# Altium footprint library ref-packages.PCBLIB: 1544 footprints (part 67 of 103)
Each footprint in its own frame and in the unit in brackets; x right, y up, seen from the top. Pads: shape width x height; smd on the part's side, far side on the other; paste and mask are expansions set on the pad; w line width, h text height; cw(c..) or ccw(c..) is an arc to the next point about the centre after c.
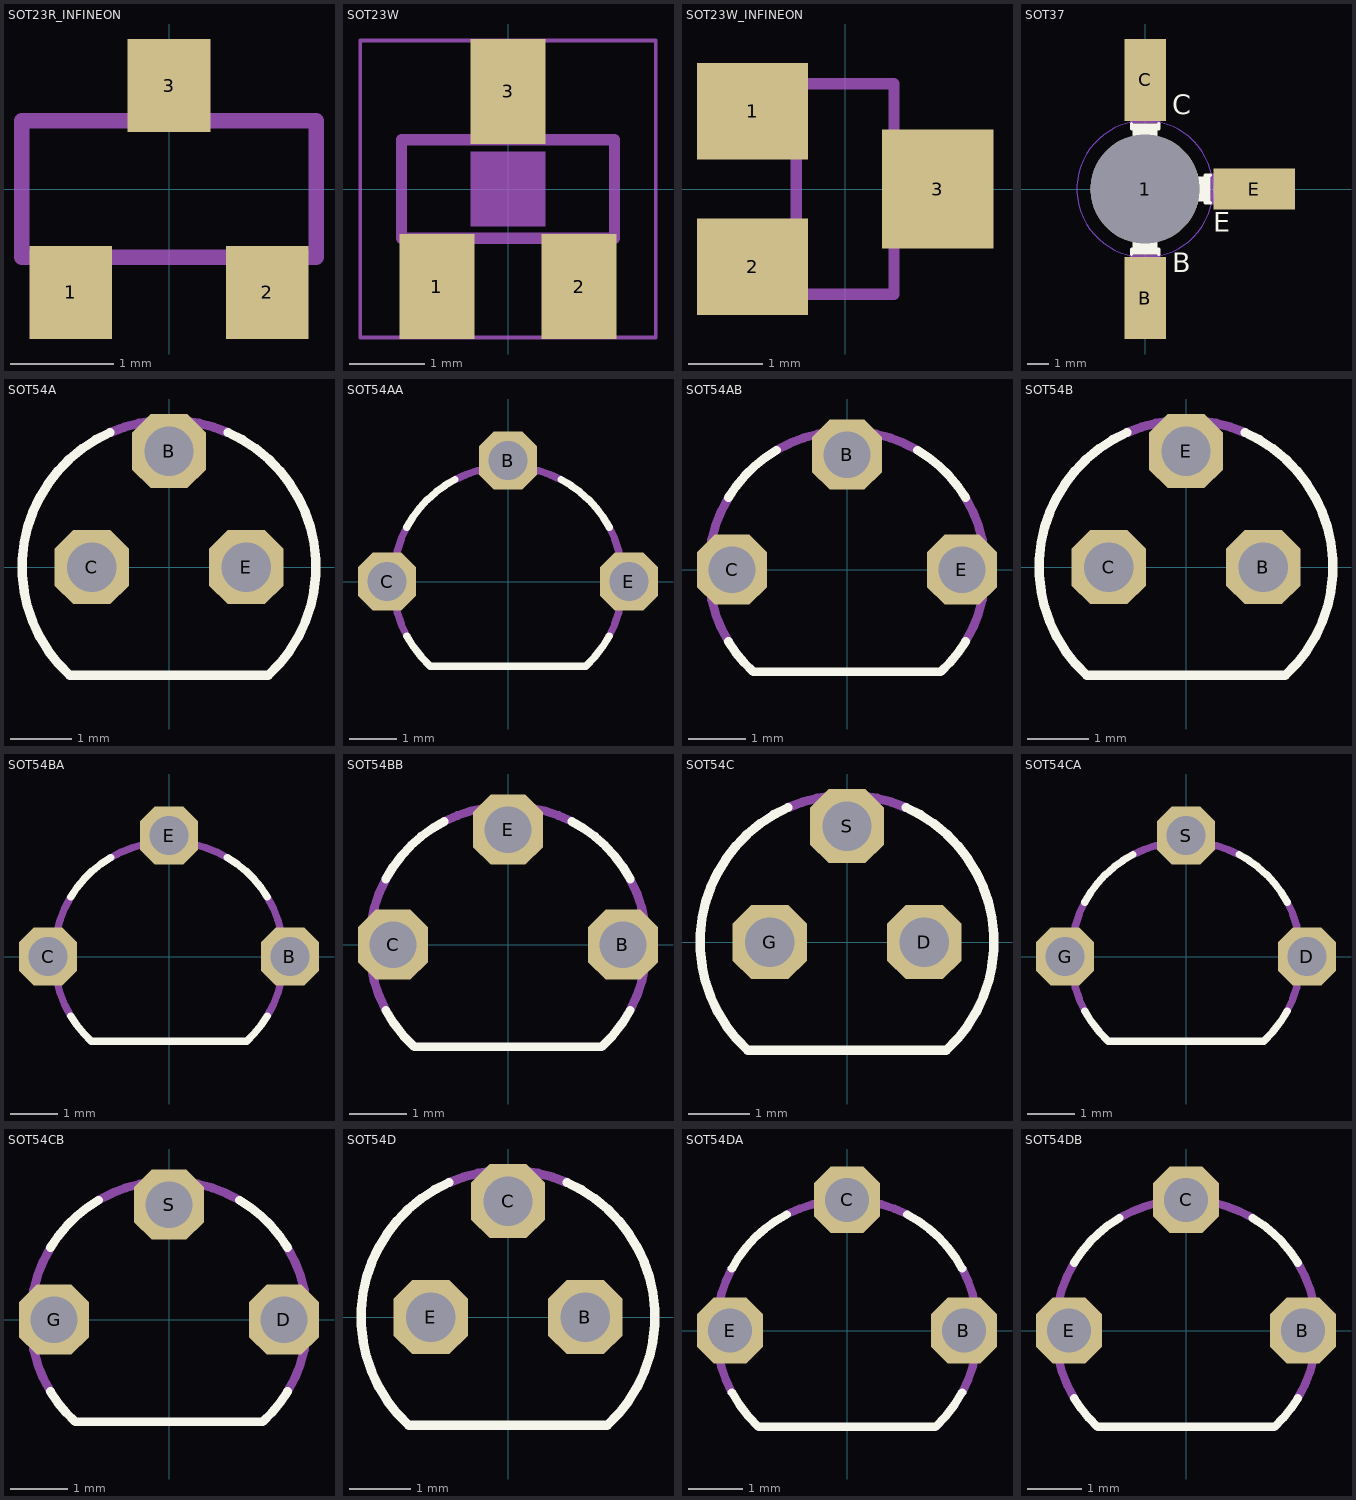
[diagram p66: the footprints below, top view; thin cyan lines are the x and y axes]

## SOT23R_INFINEON [mil]
pads (3):
  rect 31.5x35.43 smd: 1(-37.4,-39.37) 2(37.4,-39.37) 3(0,39.37)
Mechanical 16:
  rectangle: -9,28 9,51
  rectangle: 28,-51 46,-28
  rectangle: -46,-51 -28,-28
  lines w6: -56,-26 56,-26 56,26 -56,26 -56,-26

## SOT23W [mm]
pads (3):
  rect 1x1.4 smd: 1(-0.95,-1.303) 2(0.95,-1.303) 3(0,1.303)
Mechanical 6:
  rectangle: -0.5,-0.5 0.5,0.5
Mechanical 16:
  rectangle: -0.229,0.711 0.229,1.295
  rectangle: 0.711,-1.295 1.168,-0.711
  rectangle: -1.168,-1.295 -0.711,-0.711
  lines w0.152: -1.422,-0.66 1.422,-0.66 1.422,0.66 -1.422,0.66 -1.422,-0.66
Mechanical 27:
  lines w0.051: -1.973,-1.983 1.973,-1.983 1.973,1.983 -1.973,1.983 -1.973,-1.983

## SOT23W_INFINEON [mil]
pads (3):
  rect 59.06x51.18 smd: 1(-49.21,41.34) 2(-49.21,-41.34)
  rect 59.06x62.99 smd: 3(49.21,0)
Mechanical 16:
  rectangle: 28,-9 51,9
  rectangle: -51,-46 -28,-28
  rectangle: -51,28 -28,46
  lines w6: -26,-56 26,-56 26,56 -26,56 -26,-56

## SOT37 [mil]
pads (4):
  round 200 hole 200: 1(0,0)
  rect 76x150 smd: B(0,-200) C(0,200)
  rect 150x76 smd: E(200,0)
Top Layer keep-out:
  circle w0: c0,0 r125
Bottom Layer keep-out:
  circle w0: c0,0 r125
Top Overlay:
  circle w6: c0,0 r90
  circle w6: c0,60 r20
  rectangle: -20,-110 20,-95
  rectangle: -25,-120 25,-110
  rectangle: 95,-20 110,20
  rectangle: 110,-25 120,25
  rectangle: -25,110 25,120
  rectangle: -20,95 20,110
  lines w6: -25,-120 -25,-110 -20,-110 -20,-88 ; -25,120 -25,110 -20,110 -20,88 ; 20,-88 20,-110 25,-110 25,-120 ; 20,88 20,110 25,110 25,120 ; 87,20 110,20 110,25 120,25 ; 88,-20 110,-20 110,-25 120,-25
  text "E" at 125,-90 h62
  text "B" at 50,-165 h62
  text "C" at 50,125 h62
Mechanical 12:
  text "5,1" at -60,-170 h77.5
Mechanical 16:
  rectangle: -25,-135 25,-120
  rectangle: -20,-210 20,-135
  rectangle: 120,-25 135,25
  rectangle: 135,-20 210,20
  rectangle: -20,135 20,255
  rectangle: -25,120 25,135
  lines w6: -25,-120 -25,-135 -20,-135 -20,-209 20,-209 20,-135 25,-135 25,-120 ; -25,120 -25,135 -20,135 -20,256 20,256 20,135 25,135 25,120 ; 120,-25 135,-25 135,-20 209,-20 209,20 135,20 135,25 120,25

## SOT54A [mil]
pads (3):
  oct 48x48 hole 32: B(0,75) C(-50,0) E(50,0)
Top Overlay:
  lines w6: -38.15,87 ccw(c0.01,0) -64.21,-70 64.21,-70 ccw(c-0.01,0) 38.15,87
Mechanical 16:
  lines w6: -38.16,87 cw(c0,-0.01) 38.16,87

## SOT54AA [mil]
pads (3):
  oct 48x48 hole 32: B(0,100) C(-100,0) E(100,0)
Top Overlay:
  lines w6: -83.68,44.98 cw(c0,-0.01) -43.72,84.34 ; -83.67,-44.98 ccw(c0.01,0.03) -64.21,-70 64.21,-70 ccw(c-0.01,0.03) 83.67,-44.98 ; 43.72,84.34 cw(c0,-0.01) 83.68,44.98
Mechanical 16:
  lines w6: -83.68,-44.98 cw(c0,0) -83.68,44.98 ; -43.72,84.34 cw(c0,0) 43.72,84.34 ; 83.68,-44.98 ccw(c0,0) 83.68,44.98

## SOT54AB [mil]
pads (3):
  oct 48x48 hole 32: B(0,78.74) C(-78.74,0) E(78.74,0)
Top Overlay:
  lines w6: -81.25,-49.23 ccw(c-0.02,0.01) -64.22,-70 64.21,-70 ccw(c-0.01,0.02) 81.24,-49.23 ; -81.25,49.23 cw(c-0.01,0.01) -48.24,81.84 ; 48.24,81.84 cw(c0.01,0.01) 81.25,49.23
Mechanical 16:
  lines w6: -81.25,-49.23 cw(c0,0) -81.25,49.23 ; -48.24,81.84 cw(c0,-0.01) 48.24,81.84 ; 81.25,-49.23 ccw(c0,0) 81.25,49.23

## SOT54B [mil]
pads (3):
  oct 48x48 hole 32: B(50,0) C(-50,0) E(0,75)
Top Overlay:
  lines w6: -38.15,87 ccw(c0.01,0) -64.21,-70 64.21,-70 ccw(c-0.01,0) 38.15,87
Mechanical 16:
  lines w6: -38.16,87 cw(c0,-0.01) 38.16,87

## SOT54BA [mil]
pads (3):
  oct 48x48 hole 32: B(100,0) C(-100,0) E(0,100)
Top Overlay:
  lines w6: -81.25,-49.23 ccw(c-0.02,0.01) -64.22,-70 64.21,-70 ccw(c-0.01,0.02) 81.24,-49.23 ; -81.25,49.23 cw(c-0.01,0.01) -48.24,81.84 ; 48.24,81.84 cw(c0.01,0.01) 81.25,49.23
Mechanical 16:
  lines w6: -81.25,-49.23 cw(c0,0) -81.25,49.23 ; -48.24,81.84 cw(c0,-0.01) 48.24,81.84 ; 81.25,-49.23 ccw(c0,0) 81.25,49.23

## SOT54BB [mil]
pads (3):
  oct 48x48 hole 32: B(78.74,0) C(-78.74,0) E(0,78.74)
Top Overlay:
  lines w6: -83.68,44.98 cw(c0,-0.01) -43.72,84.34 ; -83.67,-44.98 ccw(c0.01,0.03) -64.21,-70 64.21,-70 ccw(c-0.01,0.03) 83.67,-44.98 ; 43.72,84.34 cw(c0,-0.01) 83.68,44.98
Mechanical 16:
  lines w6: -83.68,-44.98 cw(c0,0) -83.68,44.98 ; -43.72,84.34 cw(c0,0) 43.72,84.34 ; 83.68,-44.98 ccw(c0,0) 83.68,44.98

## SOT54C [mil]
pads (3):
  oct 48x48 hole 32: D(50,0) G(-50,0) S(0,75)
Top Overlay:
  lines w6: -38.15,87 ccw(c0.01,0) -64.21,-70 64.21,-70 ccw(c-0.01,0) 38.15,87
Mechanical 16:
  lines w6: -38.16,87 cw(c0,-0.01) 38.16,87

## SOT54CA [mil]
pads (3):
  oct 48x48 hole 32: D(100,0) G(-100,0) S(0,100)
Top Overlay:
  lines w6: -83.68,44.98 cw(c0,-0.01) -43.72,84.34 ; -83.67,-44.98 ccw(c0.01,0.03) -64.21,-70 64.21,-70 ccw(c-0.01,0.03) 83.67,-44.98 ; 43.72,84.34 cw(c0,-0.01) 83.68,44.98
Mechanical 16:
  lines w6: -83.68,-44.98 cw(c0,0) -83.68,44.98 ; -43.72,84.34 cw(c0,0) 43.72,84.34 ; 83.68,-44.98 ccw(c0,0) 83.68,44.98

## SOT54CB [mil]
pads (3):
  oct 48x48 hole 32: D(78.74,0) G(-78.74,0) S(0,78.74)
Top Overlay:
  lines w6: -81.25,-49.23 ccw(c-0.02,0.01) -64.22,-70 64.21,-70 ccw(c-0.01,0.02) 81.24,-49.23 ; -81.25,49.23 cw(c-0.01,0.01) -48.24,81.84 ; 48.24,81.84 cw(c0.01,0.01) 81.25,49.23
Mechanical 16:
  lines w6: -81.25,-49.23 cw(c0,0) -81.25,49.23 ; -48.24,81.84 cw(c0,-0.01) 48.24,81.84 ; 81.25,-49.23 ccw(c0,0) 81.25,49.23

## SOT54D [mil]
pads (3):
  oct 48x48 hole 32: B(50,0) C(0,75) E(-50,0)
Top Overlay:
  lines w6: -38.15,87 ccw(c0.01,0) -64.21,-70 64.21,-70 ccw(c-0.01,0) 38.15,87
Mechanical 16:
  lines w6: -38.16,87 cw(c0,-0.01) 38.16,87

## SOT54DA [mil]
pads (3):
  oct 48x48 hole 32: B(85,0) C(0,95) E(-85,0)
Top Overlay:
  lines w6: -83.68,44.98 cw(c0,-0.01) -43.72,84.34 ; -83.67,-44.98 ccw(c0.01,0.03) -64.21,-70 64.21,-70 ccw(c-0.01,0.03) 83.67,-44.98 ; 43.72,84.34 cw(c0,-0.01) 83.68,44.98
Mechanical 16:
  lines w6: -83.68,-44.98 cw(c0,0) -83.68,44.98 ; -43.72,84.34 cw(c0,0) 43.72,84.34 ; 83.68,-44.98 ccw(c0,0) 83.68,44.98

## SOT54DB [mil]
pads (3):
  oct 48x48 hole 32: B(85,0) C(0,95) E(-85,0)
Top Overlay:
  lines w6: -81.25,-49.23 ccw(c-0.02,0.01) -64.22,-70 64.21,-70 ccw(c-0.01,0.02) 81.24,-49.23 ; -81.25,49.23 cw(c-0.01,0.01) -48.24,81.84 ; 48.24,81.84 cw(c0.01,0.01) 81.25,49.23
Mechanical 16:
  lines w6: -81.25,-49.23 cw(c0,0) -81.25,49.23 ; -48.24,81.84 cw(c0,-0.01) 48.24,81.84 ; 81.25,-49.23 ccw(c0,0) 81.25,49.23